# Altium footprint library PBL - THD Packages.PcbLib: 256 footprints (part 8 of 16)
Each footprint in its own frame and in the unit in brackets; x right, y up, seen from the top. Pads: shape width x height; smd on the part's side, far side on the other; paste and mask are expansions set on the pad; w line width, h text height; cw(c..) or ccw(c..) is an arc to the next point about the centre after c.
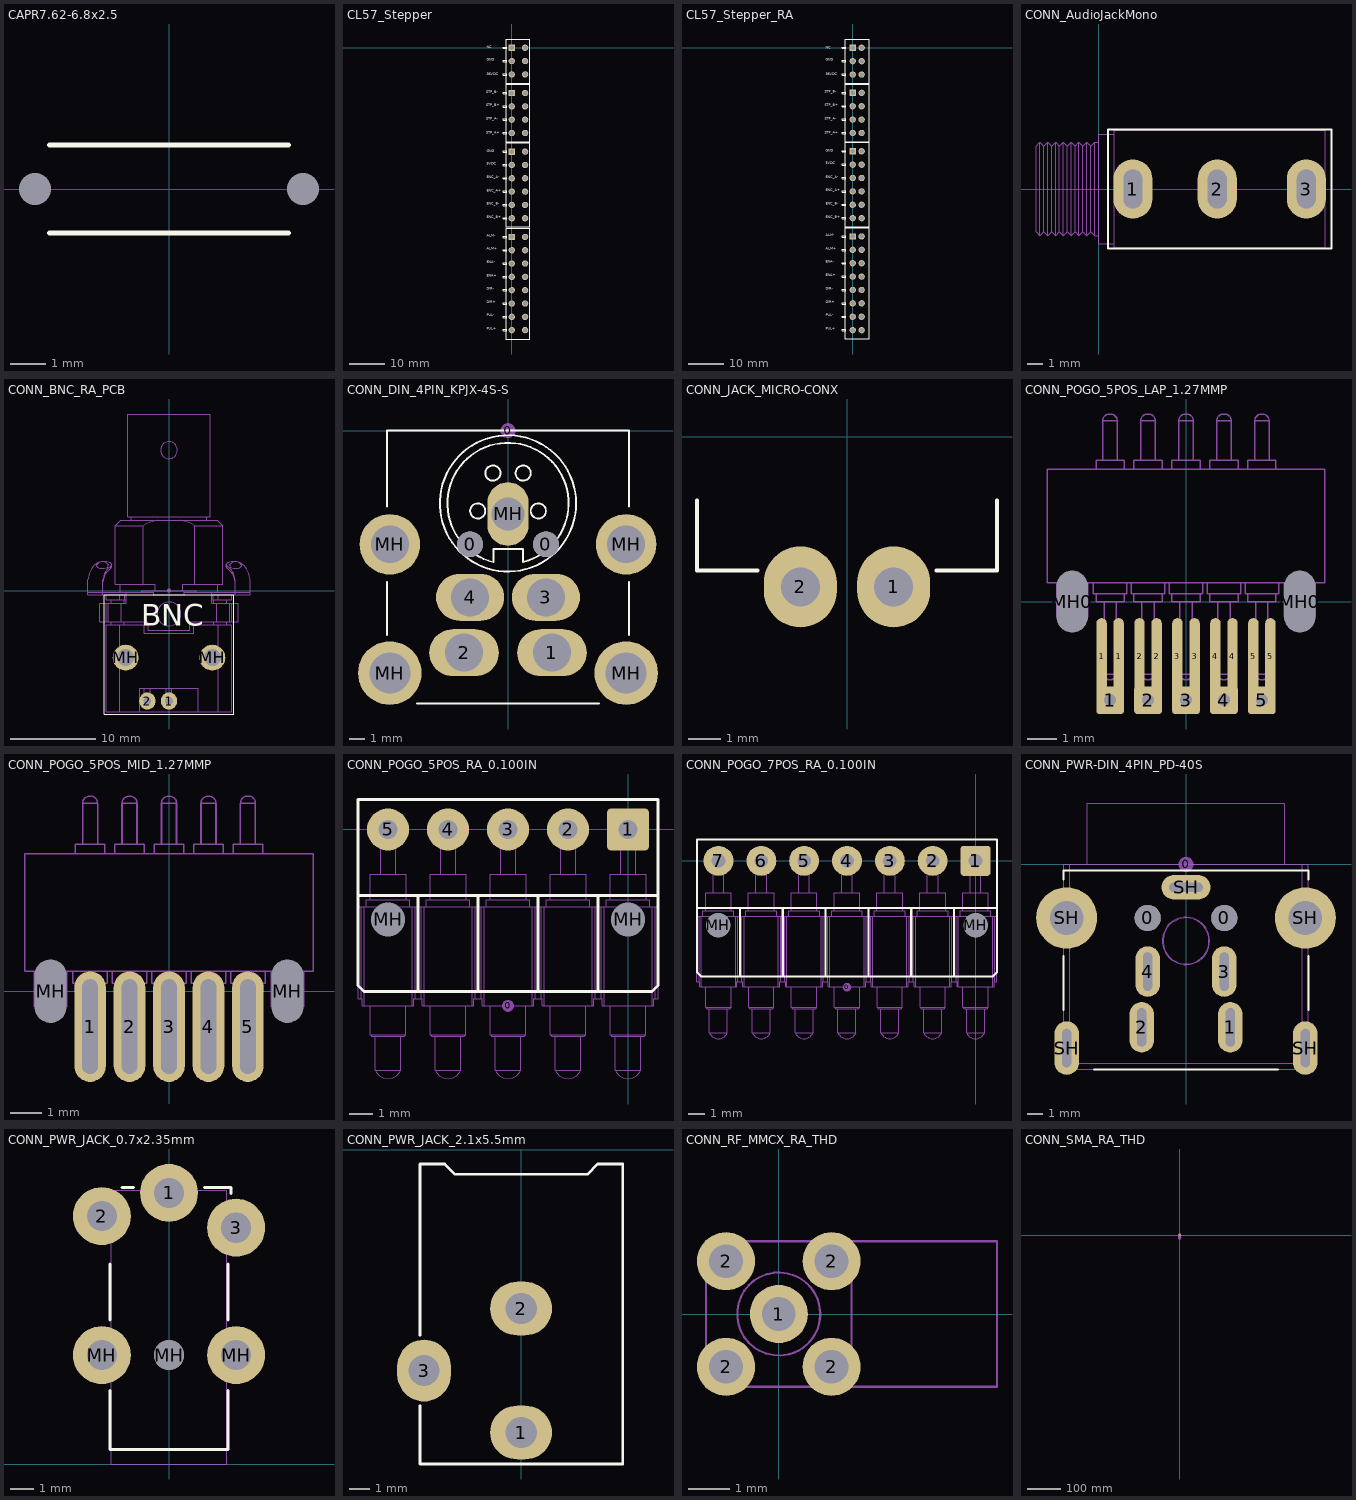
[diagram p7: the footprints below, top view; thin cyan lines are the x and y axes]

## CAPR7.62-6.8x2.5 [mil] "Capacitor, MF, Thru-Hole, Dipped Radial; Body 6.8 x 2.5 mm (WxT) Pin Spacing 7.62 mm (typ)"
height 236.22
pads (2):
  round 0 / inner round 0 / far side oval 100x85 hole 36 unplated: 1(-150,0) 2(150,0)
Top Overlay:
  lines w6: -133.86,-49.21 133.86,-49.21 ; -133.86,49.21 133.86,49.21
3D body "CAPMF_10.3x6.0x13.0mm WxTxH 7.5mmLS.STEP": height 511.81, standoff -100, extent -202.75,-118.1 202.76,118.12

## CL57_Stepper [mm]
pads (42):
  rect 1.8x1.8 hole 1.3: 1(0,0) 4(0,-12.954) 8(0,-29.718) 14(0,-54.102)
  round 1.8 hole 1.3: 1(3.81,0) 2(0,-3.81) 2(3.81,-3.81) 3(0,-7.62) 3(3.81,-7.62) 4(3.81,-12.954) 5(0,-16.764) 5(3.81,-16.764) 6(0,-20.574) 6(3.81,-20.574) 7(0,-24.384) 7(3.81,-24.384) 8(3.81,-29.718) 9(0,-33.528) 9(3.81,-33.528) 10(0,-37.338) 10(3.81,-37.338) 11(0,-41.148) 11(3.81,-41.148) 12(0,-44.958) 12(3.81,-44.958) 13(0,-48.768) 13(3.81,-48.768) 14(3.81,-54.102) 15(0,-57.912) 15(3.81,-57.912) 16(0,-61.722) 16(3.81,-61.722) 17(0,-65.532) 17(3.81,-65.532) 18(0,-69.342) 18(3.81,-69.342) 19(0,-73.152) 19(3.81,-73.152) 20(0,-76.962) 20(3.81,-76.962) 21(0,-80.772) 21(3.81,-80.772)
Top Overlay:
  lines w0.1: -2.4,-80.972 -2.4,-80.572 -1.4,-80.572 -1.4,-80.972 -2.4,-80.972 ; -2.4,-77.162 -2.4,-76.762 -1.4,-76.762 -1.4,-77.162 -2.4,-77.162 ; -2.4,-73.352 -2.4,-72.952 -1.4,-72.952 -1.4,-73.352 -2.4,-73.352 ; -2.4,-69.542 -2.4,-69.142 -1.4,-69.142 -1.4,-69.542 -2.4,-69.542 ; -2.4,-65.732 -2.4,-65.332 -1.4,-65.332 -1.4,-65.732 -2.4,-65.732 ; -2.4,-61.922 -2.4,-61.522 -1.4,-61.522 -1.4,-61.922 -2.4,-61.922 ; -2.4,-58.112 -2.4,-57.712 -1.4,-57.712 -1.4,-58.112 -2.4,-58.112 ; -2.4,-54.302 -2.4,-53.902 -1.4,-53.902 -1.4,-54.302 -2.4,-54.302 ; -2.4,-48.968 -2.4,-48.568 -1.4,-48.568 -1.4,-48.968 -2.4,-48.968 ; -2.4,-45.158 -2.4,-44.758 -1.4,-44.758 -1.4,-45.158 -2.4,-45.158 ; -2.4,-41.348 -2.4,-40.948 -1.4,-40.948 -1.4,-41.348 -2.4,-41.348 ; -2.4,-37.538 -2.4,-37.138 -1.4,-37.138 -1.4,-37.538 -2.4,-37.538 ; -2.4,-33.728 -2.4,-33.328 -1.4,-33.328 -1.4,-33.728 -2.4,-33.728 ; -2.4,-29.918 -2.4,-29.518 -1.4,-29.518 -1.4,-29.918 -2.4,-29.918 ; -2.4,-24.584 -2.4,-24.184 -1.4,-24.184 -1.4,-24.584 -2.4,-24.584 ; -2.4,-20.774 -2.4,-20.374 -1.4,-20.374 -1.4,-20.774 -2.4,-20.774 ; -2.4,-16.964 -2.4,-16.564 -1.4,-16.564 -1.4,-16.964 -2.4,-16.964 ; -2.4,-13.154 -2.4,-12.754 -1.4,-12.754 -1.4,-13.154 -2.4,-13.154 ; -2.4,-7.82 -2.4,-7.42 -1.4,-7.42 -1.4,-7.82 -2.4,-7.82 ; -2.4,-4.01 -2.4,-3.61 -1.4,-3.61 -1.4,-4.01 -2.4,-4.01 ; -2.4,-0.2 -2.4,0.2 -1.4,0.2 -1.4,-0.2 -2.4,-0.2 ; -1.7,-83.302 -1.7,-51.602 5.2,-51.602 5.2,-83.302 -1.7,-83.302 ; -1.7,-51.218 5.2,-51.218 5.2,-27.218 -1.7,-27.218 -1.7,-51.218 ; -1.7,-26.854 -1.7,-10.454 5.2,-10.454 5.2,-26.854 -1.7,-26.854 ; -1.7,-10.1 -1.7,2.5 5.2,2.5 5.2,-10.1 -1.7,-10.1
  text "PUL+" at -7.112,-80.959 h1.2
  text "PUL-" at -7.112,-77.149 h1.2
  text "DIR+" at -7.112,-73.352 h1.2
  text "DIR-" at -7.112,-69.542 h1.2
  text "ENA+" at -7.112,-65.732 h1.2
  text "ENA-" at -7.112,-61.922 h1.2
  text "ALM+" at -7.112,-58.112 h1.2
  text "ALM-" at -7.112,-54.302 h1.2
  text "STP_B-" at -7.366,-13.249 h1.2
  text "STP_B+" at -7.366,-17.059 h1.2
  text "STP_A-" at -7.366,-20.869 h1.2
  text "STP_A+" at -7.366,-24.933 h1.2
  text "GND" at -7.112,-30.213 h1.2
  text "5VDC" at -7.112,-33.715 h1.2
  text "NC" at -7.112,-0.495 h1.2
  text "GND" at -7.112,-3.997 h1.2
  text "36VDC" at -7.112,-8.115 h1.2
  text "ENC_B-" at -7.112,-45.253 h1.2
  text "ENC_B+" at -7.112,-49.063 h1.2
  text "ENC_A+" at -7.112,-41.443 h1.2
  text "ENC_A-" at -7.112,-37.633 h1.2
3D body "CL57_asm.STEP": height 79.2, standoff 10, extent -10.668,-99.49 15.832,16.51

## CL57_Stepper_RA [mm]
pads (42):
  rect 1.8x1.8 hole 1.3: 1(0,0) 4(0,-12.827) 8(0,-29.464) 14(0,-53.721)
  round 1.8 hole 1.3: 1(2.54,0) 2(0,-3.81) 2(2.54,-3.81) 3(0,-7.62) 3(2.54,-7.62) 4(2.54,-12.827) 5(0,-16.637) 5(2.54,-16.637) 6(0,-20.447) 6(2.54,-20.447) 7(0,-24.257) 7(2.54,-24.257) 8(2.54,-29.464) 9(0,-33.274) 9(2.54,-33.274) 10(0,-37.084) 10(2.54,-37.084) 11(0,-40.894) 11(2.54,-40.894) 12(0,-44.704) 12(2.54,-44.704) 13(0,-48.514) 13(2.54,-48.514) 14(2.54,-53.721) 15(0,-57.531) 15(2.54,-57.531) 16(0,-61.341) 16(2.54,-61.341) 17(0,-65.151) 17(2.54,-65.151) 18(0,-68.961) 18(2.54,-68.961) 19(0,-72.771) 19(2.54,-72.771) 20(0,-76.581) 20(2.54,-76.581) 21(0,-80.391) 21(2.54,-80.391)
Top Overlay:
  lines w0.1: -2.94,-80.591 -1.94,-80.591 -1.94,-80.191 -2.94,-80.191 -2.94,-80.591 ; -2.94,-76.781 -1.94,-76.781 -1.94,-76.381 -2.94,-76.381 -2.94,-76.781 ; -2.94,-72.971 -1.94,-72.971 -1.94,-72.571 -2.94,-72.571 -2.94,-72.971 ; -2.94,-69.161 -1.94,-69.161 -1.94,-68.761 -2.94,-68.761 -2.94,-69.161 ; -2.94,-65.351 -1.94,-65.351 -1.94,-64.951 -2.94,-64.951 -2.94,-65.351 ; -2.94,-61.541 -1.94,-61.541 -1.94,-61.141 -2.94,-61.141 -2.94,-61.541 ; -2.94,-57.731 -1.94,-57.731 -1.94,-57.331 -2.94,-57.331 -2.94,-57.731 ; -2.94,-53.921 -1.94,-53.921 -1.94,-53.521 -2.94,-53.521 -2.94,-53.921 ; -2.94,-48.714 -1.94,-48.714 -1.94,-48.314 -2.94,-48.314 -2.94,-48.714 ; -2.94,-44.904 -1.94,-44.904 -1.94,-44.504 -2.94,-44.504 -2.94,-44.904 ; -2.94,-41.094 -1.94,-41.094 -1.94,-40.694 -2.94,-40.694 -2.94,-41.094 ; -2.94,-37.284 -1.94,-37.284 -1.94,-36.884 -2.94,-36.884 -2.94,-37.284 ; -2.94,-33.474 -1.94,-33.474 -1.94,-33.074 -2.94,-33.074 -2.94,-33.474 ; -2.94,-29.664 -1.94,-29.664 -1.94,-29.264 -2.94,-29.264 -2.94,-29.664 ; -2.94,-24.457 -1.94,-24.457 -1.94,-24.057 -2.94,-24.057 -2.94,-24.457 ; -2.94,-20.647 -1.94,-20.647 -1.94,-20.247 -2.94,-20.247 -2.94,-20.647 ; -2.94,-16.837 -1.94,-16.837 -1.94,-16.437 -2.94,-16.437 -2.94,-16.837 ; -2.94,-13.027 -1.94,-13.027 -1.94,-12.627 -2.94,-12.627 -2.94,-13.027 ; -2.94,-7.82 -1.94,-7.82 -1.94,-7.42 -2.94,-7.42 -2.94,-7.82 ; -2.94,-4.01 -1.94,-4.01 -1.94,-3.61 -2.94,-3.61 -2.94,-4.01 ; -2.94,-0.2 -1.94,-0.2 -1.94,0.2 -2.94,0.2 -2.94,-0.2 ; -2.24,-82.921 4.66,-82.921 4.66,-51.221 -2.24,-51.221 -2.24,-82.921 ; -2.24,-50.964 -2.24,-26.964 4.66,-26.964 4.66,-50.964 -2.24,-50.964 ; -2.24,-26.727 4.66,-26.727 4.66,-10.327 -2.24,-10.327 -2.24,-26.727 ; -2.24,-10.1 4.66,-10.1 4.66,2.5 -2.24,2.5 -2.24,-10.1
  text "ENC_A-" at -7.652,-37.379 h1.2
  text "ENC_A+" at -7.652,-41.189 h1.2
  text "ENC_B+" at -7.652,-48.809 h1.2
  text "ENC_B-" at -7.652,-44.999 h1.2
  text "36VDC" at -7.652,-8.115 h1.2
  text "GND" at -7.652,-3.997 h1.2
  text "NC" at -7.652,-0.495 h1.2
  text "5VDC" at -7.652,-33.461 h1.2
  text "GND" at -7.652,-29.959 h1.2
  text "STP_A+" at -7.906,-24.806 h1.2
  text "STP_A-" at -7.906,-20.742 h1.2
  text "STP_B+" at -7.906,-16.932 h1.2
  text "STP_B-" at -7.906,-13.122 h1.2
  text "ALM-" at -7.652,-53.921 h1.2
  text "ALM+" at -7.652,-57.731 h1.2
  text "ENA-" at -7.652,-61.541 h1.2
  text "ENA+" at -7.652,-65.351 h1.2
  text "DIR-" at -7.652,-69.161 h1.2
  text "DIR+" at -7.652,-72.971 h1.2
  text "PUL-" at -7.652,-76.768 h1.2
  text "PUL+" at -7.652,-80.578 h1.2
3D body "CL57_asm.STEP": height 16.5, standoff -10, extent 6.6,-98 75.8,18

## CONN_AudioJackMono [mm] "CUI MJ-3502 3.5mm audio jack - mono"
height 11.3
pads (3):
  oval 2.5x3.8 hole 1.2 slot 2.5 at 90 deg: 1(2.2,0) 2(7.6,0) 3(13.3,0)
Top Overlay:
  lines w0.127: 0.6,-3.8 14.9,-3.8 14.9,3.8 0.6,3.8 0.6,-3.8
13 - 3D Top Side:
  lines w0.05: 0,-3 -0.25,-3 ; 0,3 -0.25,3 ; 1,-3.5 0,-3.5 0,3.5 1,3.5 ; -3.75,-3 -3.75,3 ; -3.75,-3 -3.5,-2.75 ; -3.75,-3 -4,-2.75 -4,2.75 -3.75,3 ; -3.75,3 -3.5,2.75 ; -3.5,-2.75 -3.5,2.75 ; -3.5,-2.75 -3.25,-3 ; -3.5,2.75 -3.25,3 ; -3.25,-3 -3.25,3 ; -3.25,-3 -3,-2.75 ; -3.25,3 -3,2.75 ; -3,-2.75 -3,2.75 ; -3,-2.75 -2.75,-3 ; -3,2.75 -2.75,3 ; -2.75,-3 -2.75,3 ; -2.75,-3 -2.5,-2.75 ; -2.75,3 -2.5,2.75 ; -2.5,-2.75 -2.5,2.75 ; -2.5,-2.75 -2.25,-3 ; -2.5,2.75 -2.25,3 ; -2.25,-3 -2.25,3 ; -2.25,-3 -2,-2.75 ; -2.25,3 -2,2.75 ; -2,-2.75 -2,2.75 ; -2,-2.75 -1.75,-3 ; -2,2.75 -1.75,3 ; -1.75,-3 -1.75,3 ; -1.75,-3 -1.5,-2.75 ; -1.75,3 -1.5,2.75 ; -1.5,-2.75 -1.5,2.75 ; -1.5,-2.75 -1.25,-3 ; -1.5,2.75 -1.25,3 ; -1.25,-3 -1.25,3 ; -1.25,-3 -1,-2.75 ; -1.25,3 -1,2.75 ; -1,-2.75 -1,2.75 ; -1,-2.75 -0.75,-3 ; -1,2.75 -0.75,3 ; -0.75,-3 -0.75,3 ; -0.75,-3 -0.5,-2.75 ; -0.75,3 -0.5,2.75 ; -0.5,-2.75 -0.5,2.75 ; -0.5,-2.75 -0.25,-3 ; -0.5,2.75 -0.25,3 ; -0.25,-3 -0.25,3 ; 1,-3.75 1,3.75 14.5,3.75 14.5,-3.75 1,-3.75
3D body "Mono Connector MJ-3502.STEP": height 11.3, standoff -4.1, extent -4,-3.75 14.5,3.75

## CONN_BNC_RA_PCB [mil] "BNC connector, right angle PCB-mounted"
height 530
pads (5):
  round 20 on Mech15: 0(0,0)
  oval 75x80 hole 35: 1(0,-510) 2(-100,-510)
  round 120 hole 79: MH(-200,-310) MH(200,-310)
Top Overlay:
  lines w5: -300,-570 300,-570 300,-20 -300,-20 -300,-570
  text "BNC" at -127.35,-163 h100
13 - 3D Top Side:
  drawing of 173 lines, arcs and shapes, not listed
3D body "BNC Conn RA PCB Mount.STEP": height 532, standoff -135, extent -375,-559.78 375,815.22

## CONN_DIN_4PIN_KPJX-4S-S [mm] "Power Connector, 4-pin DIN"
height 15
pads (12):
  round 1.7 hole 1.7 unplated: 0(-2.5,-7.5) 0(2.5,-7.5)
  round 1 on Mech15: 0(0,0)
  oval 4.6x3.1 hole 2.5: 1(2.9,-14.65) 2(-2.9,-14.65)
  oval 4.5x3.1 hole 2.5: 3(2.5,-11) 4(-2.5,-11)
  round 4.2 hole 2.7: MH(-7.8,-16) MH(7.8,-16)
  round 4 hole 2.5: MH(-7.8,-7.5) MH(7.8,-7.5)
  oval 2.7x4.2 hole 2.2: MH(0,-5.5)
Top Overlay:
  circle w0.127: c0,-4.8 r4.5
  circle w0.127: c1,-2.8 r0.5
  circle w0.127: c-1,-2.8 r0.5
  circle w0.127: c-2,-5.3 r0.5
  circle w0.127: c2,-5.3 r0.5
  lines w0.127: -8,-13.5 -8,-10 ; -8,-5 -8,0 8,0 8,-5 ; -6,-18 6,-18 ; 1,-8.671 1,-7.8 -0.97,-7.8 -0.97,-8.681 cw(c0,-4.8) 1.007,-8.671 ; 8,-13.5 8,-10
3D body "User Library-KPJX-4S-S.STEP": height 15.01, standoff -3.49, extent -8,-17.65 8,0

## CONN_JACK_MICRO-CONX [mil] "Micro-ConX 17292-2PG-300"
height 480
pads (2):
  oval 90x100 hole 48: 1(57.5,-185) 2(-57.5,-185)
Top Overlay:
  lines w5: -185,-78.74 -185,-165 -110.24,-165 ; 110.24,-165 185,-165 185,-78.74
3D body "Micro-ConX for PCB mount.STEP": height 476.88, standoff -146.88, extent -312.51,-205 310.03,547.5

## CONN_POGO_5POS_LAP_1.27MMP [mm] "Programming connector; lap-soldered 5 Position pogo style, 0.050\" pitch"
height 1.308
pads (17):
  oval 0.35x2.54 smd: 1(-2.825,-1.825) 1(-2.255,-1.825) 2(-1.555,-1.825) 2(-0.985,-1.825) 3(-0.285,-1.825) 3(0.285,-1.825) 4(0.985,-1.825) 4(1.555,-1.825) 5(2.255,-1.825) 5(2.825,-1.825)
  rrect20% 0.925x0.925 hole 0.4 mask+0.1: 1(-2.54,-3.3) 2(-1.27,-3.3) 3(0,-3.3) 4(1.27,-3.3) 5(2.54,-3.3)
  oval 0.991x2.007 hole 1.041 slot 2.057 at 90 deg unplated: MH0(-3.81,0) MH0(3.81,0)
Top Solder:
  rectangle: -2.825,-3.075 -2.25,-0.575
  rectangle: -1.555,-3.075 -0.98,-0.575
  rectangle: -0.285,-3.075 0.29,-0.575
  rectangle: 0.985,-3.075 1.56,-0.575
  rectangle: 2.255,-3.075 2.83,-0.575
13 - 3D Top Side:
  lines w0.05: -4.331,0.635 -4.331,-0.508 -3.289,-0.508 -3.289,0.635 ; -3.099,0.635 -3.099,0.254 -1.981,0.254 -1.981,0.635 ; -3.01,0.254 -3.01,0 -2.07,0 -2.07,0.254 ; -3.01,4.42 -3.01,4.724 -2.07,4.724 -2.07,4.42 ; -2.781,4.724 -2.781,6.045 ; -2.743,0 -2.743,-2.438 ; -2.337,0 -2.337,-2.438 ; -2.299,4.724 -2.299,6.045 ; -1.829,0.635 -1.829,0.254 -0.711,0.254 -0.711,0.635 ; -1.74,0.254 -1.74,0 -0.8,0 -0.8,0.254 ; -1.74,4.42 -1.74,4.724 -0.8,4.724 -0.8,4.42 ; -1.511,4.724 -1.511,6.045 ; -1.473,0 -1.473,-2.438 ; -1.067,0 -1.067,-2.438 ; -1.029,4.724 -1.029,6.045 ; -0.559,0.635 -0.559,0.254 0.559,0.254 0.559,0.635 ; -0.47,0.254 -0.47,0 0.47,0 0.47,0.254 ; -0.47,4.42 -0.47,4.724 0.47,4.724 0.47,4.42 ; -0.241,4.724 -0.241,6.045 ; -0.203,0 -0.203,-2.438 ; 0.203,0 0.203,-2.438 ; 0.241,4.724 0.241,6.045 ; 0.711,0.635 0.711,0.254 1.829,0.254 1.829,0.635 ; 0.8,0.254 0.8,0 1.74,0 1.74,0.254 ; 0.8,4.42 0.8,4.724 1.74,4.724 1.74,4.42 ; 1.029,4.724 1.029,6.045 ; 1.067,0 1.067,-2.438 ; 1.473,0 1.473,-2.438 ; 1.511,4.724 1.511,6.045 ; 1.981,0.635 1.981,0.254 3.099,0.254 3.099,0.635 ; 2.07,0.254 2.07,0 3.01,0 3.01,0.254 ; 2.07,4.42 2.07,4.724 3.01,4.724 3.01,4.42 ; 2.299,4.724 2.299,6.045 ; 2.337,0 2.337,-2.438 ; 2.743,0 2.743,-2.438 ; 2.781,4.724 2.781,6.045 ; 3.289,0.635 3.289,-0.508 4.331,-0.508 4.331,0.635 ; -2.781,6.045 cw(c-2.553,6.045) -2.553,6.274 -2.527,6.274 cw(c-2.527,6.045) -2.299,6.045 ; -2.781,6.045 -2.299,6.045 ; -2.743,-2.438 ccw(c-2.565,-2.438) -2.565,-2.616 -2.515,-2.616 ccw(c-2.515,-2.438) -2.337,-2.438 ; -2.743,-2.438 -2.337,-2.438 ; -1.511,6.045 cw(c-1.283,6.045) -1.283,6.274 -1.257,6.274 cw(c-1.257,6.045) -1.029,6.045 ; -1.511,6.045 -1.029,6.045 ; -1.473,-2.438 ccw(c-1.295,-2.438) -1.295,-2.616 -1.245,-2.616 ccw(c-1.245,-2.438) -1.067,-2.438 ; -1.473,-2.438 -1.067,-2.438 ; -0.241,6.045 cw(c-0.013,6.045) -0.013,6.274 0.013,6.274 cw(c0.013,6.045) 0.241,6.045 ; -0.241,6.045 0.241,6.045 ; -0.203,-2.438 ccw(c-0.025,-2.438) -0.025,-2.616 0.025,-2.616 ccw(c0.025,-2.438) 0.203,-2.438 ; -0.203,-2.438 0.203,-2.438 ; 1.029,6.045 cw(c1.257,6.045) 1.257,6.274 1.283,6.274 cw(c1.283,6.045) 1.511,6.045 ; 1.029,6.045 1.511,6.045 ; 1.067,-2.438 ccw(c1.245,-2.438) 1.245,-2.616 1.295,-2.616 ccw(c1.295,-2.438) 1.473,-2.438 ; 1.067,-2.438 1.473,-2.438 ; 2.299,6.045 cw(c2.527,6.045) 2.527,6.274 2.553,6.274 cw(c2.553,6.045) 2.781,6.045 ; 2.299,6.045 2.781,6.045 ; 2.337,-2.438 ccw(c2.515,-2.438) 2.515,-2.616 2.565,-2.616 ccw(c2.565,-2.438) 2.743,-2.438 ; 2.337,-2.438 2.743,-2.438 ; -4.635,0.635 -4.635,4.42 4.635,4.42 4.635,0.635 -4.635,0.635
3D body "CONN_POGO_50MIL_05POS_LAP.STEP": height 1.31, standoff -0.9, extent -4.635,-2.616 4.636,6.274

## CONN_POGO_5POS_MID_1.27MMP [mil] "Programming connector; lap-soldered 5 Position pogo style, 0.050\" pitch"
height 13
pads (7):
  oval 40x140 hole 20 slot 120 at 90 deg: 1(-100,-45) 2(-50,-45) 3(0,-45) 4(50,-45) 5(100,-45)
  oval 38x78 hole 40 slot 80 at 90 deg unplated: MH(-150,0) MH(150,0)
Top Overlay:
  text "." at -100,-150 h3.94
Bottom Overlay:
  text "." at -100,-150 h3.94
13 - 3D Top Side:
  lines w1.97: -170.5,25 -170.5,-20 -129.5,-20 -129.5,25 ; -122,25 -122,10 -78,10 -78,25 ; -118.5,10 -118.5,0 -81.5,0 -81.5,10 ; -118.5,174 -118.5,186 -81.5,186 -81.5,174 ; -109.5,186 -109.5,238 ; -108,0 -108,-96 ; -92,0 -92,-96 ; -90.5,186 -90.5,238 ; -72,25 -72,10 -28,10 -28,25 ; -68.5,10 -68.5,0 -31.5,0 -31.5,10 ; -68.5,174 -68.5,186 -31.5,186 -31.5,174 ; -59.5,186 -59.5,238 ; -58,0 -58,-96 ; -42,0 -42,-96 ; -40.5,186 -40.5,238 ; -22,25 -22,10 22,10 22,25 ; -18.5,10 -18.5,0 18.5,0 18.5,10 ; -18.5,174 -18.5,186 18.5,186 18.5,174 ; -9.5,186 -9.5,238 ; -8,0 -8,-96 ; 8,0 8,-96 ; 9.5,186 9.5,238 ; 28,25 28,10 72,10 72,25 ; 31.5,10 31.5,0 68.5,0 68.5,10 ; 31.5,174 31.5,186 68.5,186 68.5,174 ; 40.5,186 40.5,238 ; 42,0 42,-96 ; 58,0 58,-96 ; 59.5,186 59.5,238 ; 78,25 78,10 122,10 122,25 ; 81.5,10 81.5,0 118.5,0 118.5,10 ; 81.5,174 81.5,186 118.5,186 118.5,174 ; 90.5,186 90.5,238 ; 92,0 92,-96 ; 108,0 108,-96 ; 109.5,186 109.5,238 ; 129.5,25 129.5,-20 170.5,-20 170.5,25 ; -109.5,238 cw(c-100.5,238) -100.5,247 -99.5,247 cw(c-99.5,238) -90.5,238 ; -109.5,238 -90.5,238 ; -108,-96 ccw(c-101,-96) -101,-103 -99,-103 ccw(c-99,-96) -92,-96 ; -108,-96 -92,-96 ; -59.5,238 cw(c-50.5,238) -50.5,247 -49.5,247 cw(c-49.5,238) -40.5,238 ; -59.5,238 -40.5,238 ; -58,-96 ccw(c-51,-96) -51,-103 -49,-103 ccw(c-49,-96) -42,-96 ; -58,-96 -42,-96 ; -9.5,238 cw(c-0.5,238) -0.5,247 0.5,247 cw(c0.5,238) 9.5,238 ; -9.5,238 9.5,238 ; -8,-96 ccw(c-1,-96) -1,-103 1,-103 ccw(c1,-96) 8,-96 ; -8,-96 8,-96 ; 40.5,238 cw(c49.5,238) 49.5,247 50.5,247 cw(c50.5,238) 59.5,238 ; 40.5,238 59.5,238 ; 42,-96 ccw(c49,-96) 49,-103 51,-103 ccw(c51,-96) 58,-96 ; 42,-96 58,-96 ; 90.5,238 cw(c99.5,238) 99.5,247 100.5,247 cw(c100.5,238) 109.5,238 ; 90.5,238 109.5,238 ; 92,-96 ccw(c99,-96) 99,-103 101,-103 ccw(c101,-96) 108,-96 ; 92,-96 108,-96 ; -182.5,25 182.5,25 182.5,174 -182.5,174 -182.5,25
3D body "CONN_POGO_50MIL_05POS_LAP.STEP": height 12.5, standoff -74.5, extent -182.49,-102.99 182.51,247

## CONN_POGO_5POS_RA_0.100IN [mil] "Connector; Pogo pins; 5 Position"
height 100
pads (8):
  round 20 on Mech15: 0(-200,-294)
  rrect20% 70x70 hole 32: 1(0,0)
  round 70 hole 32: 2(-100,0) 3(-200,0) 4(-300,0) 5(-400,0)
  round 55 hole 57 unplated: MH(-400,-150) MH(0,-150)
Top Overlay:
  lines w5: -450,-110 50,-110 ; -350,-270 -350,-110 ; -250,-270 -250,-110 ; -150,-270 -150,-110 ; -50,-270 -50,-110 ; -450,-260 -440,-270 40,-270 50,-260 50,50 -450,50 -450,-260
13 - 3D Top Side:
  lines w1.97: -445,-282 -445,-129 ; -440,-294 -440,-129 ; -436,-129 -436,-117 -364,-117 -364,-129 ; -430,-117 -430,-75 -370,-75 -370,-117 ; -429.5,-294 -429.5,-342.17 ; -421,-345 -421,-400.97 ; -412.5,-75 -412.5,0 cw(c-400,0) -387.5,0 -387.5,-75 ; -412.5,-25 -387.5,-25 ; -379,-345 -379,-400.97 ; -370.5,-294 -370.5,-342.17 ; -360,-294 -360,-129 ; -355,-282 -355,-129 ; -345,-282 -345,-129 ; -340,-294 -340,-129 ; -336,-129 -336,-117 -264,-117 -264,-129 ; -330,-117 -330,-75 -270,-75 -270,-117 ; -329.5,-294 -329.5,-342.17 ; -321,-345 -321,-400.97 ; -312.5,-75 -312.5,0 cw(c-300,0) -287.5,0 -287.5,-75 ; -312.5,-25 -287.5,-25 ; -279,-345 -279,-400.97 ; -270.5,-294 -270.5,-342.17 ; -260,-294 -260,-129 ; -255,-282 -255,-129 ; -245,-282 -245,-129 ; -240,-294 -240,-129 ; -236,-129 -236,-117 -164,-117 -164,-129 ; -230,-117 -230,-75 -170,-75 -170,-117 ; -229.5,-294 -229.5,-342.17 ; -221,-345 -221,-400.97 ; -212.5,-75 -212.5,0 cw(c-200,0) -187.5,0 -187.5,-75 ; -212.5,-25 -187.5,-25 ; -179,-345 -179,-400.97 ; -170.5,-294 -170.5,-342.17 ; -160,-294 -160,-129 ; -155,-282 -155,-129 ; -145,-282 -145,-129 ; -140,-294 -140,-129 ; -136,-129 -136,-117 -64,-117 -64,-129 ; -130,-117 -130,-75 -70,-75 -70,-117 ; -129.5,-294 -129.5,-342.17 ; -121,-345 -121,-400.97 ; -112.5,-75 -112.5,0 cw(c-100,0) -87.5,0 -87.5,-75 ; -112.5,-25 -87.5,-25 ; -79,-345 -79,-400.97 ; -70.5,-294 -70.5,-342.17 ; -60,-294 -60,-129 ; -55,-282 -55,-129 ; -45,-282 -45,-129 ; -40,-294 -40,-129 ; -36,-129 -36,-117 36,-117 36,-129 ; -30,-117 -30,-75 30,-75 30,-117 ; -29.5,-294 -29.5,-342.17 ; -21,-345 -21,-400.97 ; -12.5,-75 -12.5,0 cw(c0,0) 12.5,0 12.5,-75 ; -12.5,-25 12.5,-25 ; 21,-345 21,-400.97 ; 29.5,-294 29.5,-342.17 ; 40,-294 40,-129 ; 45,-282 45,-129 ; -429.5,-342.17 -370.5,-342.17 ; -429.5,-342.17 -426.67,-345 -373.33,-345 -370.5,-342.17 ; -421,-400.97 ccw(c-400,-392.27) -379,-400.97 ; -421,-400.97 -379,-400.97 ; -329.5,-342.17 -270.5,-342.17 ; -329.5,-342.17 -326.67,-345 -273.33,-345 -270.5,-342.17 ; -321,-400.97 ccw(c-300,-392.27) -279,-400.97 ; -321,-400.97 -279,-400.97 ; -229.5,-342.17 -170.5,-342.17 ; -229.5,-342.17 -226.67,-345 -173.33,-345 -170.5,-342.17 ; -221,-400.97 ccw(c-200,-392.27) -179,-400.97 ; -221,-400.97 -179,-400.97 ; -129.5,-342.17 -70.5,-342.17 ; -129.5,-342.17 -126.67,-345 -73.33,-345 -70.5,-342.17 ; -121,-400.97 ccw(c-100,-392.27) -79,-400.97 ; -121,-400.97 -79,-400.97 ; -29.5,-342.17 29.5,-342.17 ; -29.5,-342.17 -26.67,-345 26.67,-345 29.5,-342.17 ; -21,-400.97 ccw(c0,-392.27) 21,-400.97 ; -21,-400.97 21,-400.97 ; -450,-282 -450,-129 50,-129 50,-282 43.33,-282 43.33,-294 -43.33,-294 -43.33,-282 -56.67,-282 -56.67,-294 -143.33,-294 -143.33,-282 -156.67,-282 -156.67,-294 -243.33,-294 -243.33,-282 -256.67,-282 -256.67,-294 -343.33,-294 -343.33,-282 -356.67,-282 -356.67,-294 -443.33,-294 -443.33,-282 -450,-282
3D body "CONN_POGO_RA_5POS.STEP": height 100, standoff -127, extent -449.99,-414.99 50.01,12.51

## CONN_POGO_7POS_RA_0.100IN [mil] "Connector; Pogo pins; 7 Position"
height 100
pads (10):
  round 20 on Mech15: 0(-300,-295)
  rrect20% 70x70 hole 32: 1(0,0)
  round 70 hole 32: 2(-100,0) 3(-200,0) 4(-300,0) 5(-400,0) 6(-500,0) 7(-600,0)
  round 55 hole 57 unplated: MH(-600,-150) MH(0,-150)
Top Overlay:
  lines w5: -650,-110 50,-110 ; -550,-270 -550,-110 ; -450,-270 -450,-110 ; -350,-270 -350,-110 ; -250,-270 -250,-110 ; -150,-270 -150,-110 ; -50,-270 -50,-110 ; -650,-260 -650,50 50,50 50,-260 40,-270 -640,-270 -650,-260
13 - 3D Top Side:
  drawing of 200 lines, arcs and shapes, not listed
3D body "CONN_POGO_RA_7POS.STEP": height 100, standoff -127, extent -649.99,-415 50.01,12.5

## CONN_PWR-DIN_4PIN_PD-40S [mm] "Power Connector, 4-pin DIN"
height 15
pads (12):
  round 1.7 hole 1.7 unplated: 0(-2.5,-3.5) 0(2.5,-3.5)
  round 1 on Mech15: 0(0,0)
  oval 1.6x3.3 hole 0.6 slot 2.5 at 90 deg: 1(2.9,-10.65) 2(-2.9,-10.65) 3(2.5,-7) 4(-2.5,-7)
  oval 1.6x3.5 hole 0.6 slot 2.5 at 90 deg: SH(-7.8,-12) SH(7.8,-12)
  round 4 hole 2.2: SH(-7.8,-3.5) SH(7.8,-3.5)
  oval 3.2x1.6 hole 0.6 slot 2.2 at 0 deg: SH(0,-1.5)
Top Overlay:
  lines w0.127: -8,-9.5 -8,-6 ; -8,-1 -8,-0.4 8,-0.4 8,-1 ; -6,-13.4 6,-13.4 ; 8,-9.5 8,-6
13 - 3D Top Side:
  circle w0.05: c0,-5 r1.5
  circle w0.05: c0,-5 r1.55
  lines w0.05: -7.6,0 -7.6,-13.4 ; -6.45,0 -6.45,4 6.45,4 6.45,0 ; 7.6,0 7.6,-13.4 ; -8,-13 ccw(c-7.6,-13) -7.6,-13.4 ; -8,-13 -8,0 8,0 8,-13 ; -8,-13 8,-13 ; -7.6,-13.4 7.6,-13.4 ; 7.6,-13.4 ccw(c7.6,-13) 8,-13
3D body "PD-40S.STEP": height 15, standoff -3.5, extent -8,-13.4 8,4

## CONN_PWR_JACK_0.7x2.35mm [mm] "Power Connector, 0.7mm ID, 2.35mm OD"
height 5
pads (6):
  round 2.5 hole 1.3: 1(0,11.7) 2(-2.9,10.7) 3(2.9,10.2) MH(-2.9,4.7) MH(2.9,4.7)
  round 1.3 hole 1.3 unplated: MH(0,4.7)
Top Overlay:
  lines w0.127: -2.54,3.175 -2.54,0.635 2.54,0.635 2.54,3.175 ; -2.54,6.223 -2.54,8.636 ; -2.032,11.938 -1.524,11.938 ; 1.524,11.938 2.667,11.938 2.667,11.684 ; 2.54,6.223 2.54,8.636
13 - 3D Top Side:
  lines w0.05: -2.819,4.204 -2.819,5.194 ; -2.819,10.198 -2.819,11.189 ; -2.502,4.204 -3.073,4.204 -3.073,5.194 -2.502,5.194 ; -2.502,10.198 -3.073,10.198 -3.073,11.189 -2.502,11.189 ; -0.495,11.811 -0.495,11.938 0.495,11.938 0.495,11.811 ; 2.502,4.204 3.073,4.204 3.073,5.194 2.502,5.194 ; 2.502,9.716 3.073,9.716 3.073,10.706 2.502,10.706 ; 2.819,4.204 2.819,5.194 ; 2.819,9.716 2.819,10.706 ; -2.502,0 -2.502,11.811 2.502,11.811 2.502,0 -2.502,0
3D body "Conn_Kobiconn_163-4307-E.stp": height 5, standoff -2.5, extent -3.309,0 3.309,12.054

## CONN_PWR_JACK_2.1x5.5mm [mm] "Power Connector, 2.1mm ID, 5.5mm OD"
height 11
pads (3):
  oval 3x2.6 hole 1.511: 1(0,-13.7) 2(0,-7.7)
  oval 2.6x3 hole 1.511: 3(-4.7,-10.7)
Top Overlay:
  lines w0.127: -4.9,-12.4 -4.9,-15.225 4.925,-15.225 4.925,-0.7 3.7,-0.7 3.2,-1.2 -3.2,-1.2 -3.7,-0.7 -4.9,-0.7 -4.9,-9
13 - 3D Top Side:
  lines w0.076: -4.9,-12.4 -4.9,-15.225 4.925,-15.225 4.925,-0.7 3.7,-0.7 3.2,-1.2 -3.2,-1.2 -3.7,-0.7 -4.9,-0.7 -4.9,-9
3D body "3100-522 Connector.stp": height 11, standoff -3.5, extent -4.9,-14.1 4.5,0

## CONN_RF_MMCX_RA_THD [mil] "RF connector, right-angle THD, TE 1-1634010-0 or TE 1408151"
height 149.61
pads (5):
  round 55 hole 32: 1(0,0) 2(-50,-50) 2(-50,50) 2(50,-50) 2(50,50)
13 - 3D Top Side:
  circle w1.97: c-0.09,0.01 r39.37
  circle w1.97: c0,0 r13.78
  lines w1.97: -68.9,-39.37 -39.37,-39.37 -39.37,-68.9 ; -68.9,39.37 -39.37,39.37 -39.37,68.9 ; -38.07,-9.54 ccw(c-3.54,-2.06) -29.28,-26.26 ; 9.57,-38.16 ccw(c1.62,-3.49) 26.2,-29.2 ; 29.21,26.34 cw(c3.99,2.19) 38.14,9.49 ; 37.1,-13.16 ccw(c4.48,-1.02) 39.27,-2.07 ; 39.37,-68.9 39.37,-39.37 68.9,-39.37 ; 39.37,68.9 39.37,39.37 68.9,39.37 ; 68.9,-68.9 68.9,68.9 ; -68.9,-68.9 -68.9,68.9 206.69,68.9 206.69,-68.9 -68.9,-68.9 ; -59.84,-59.84 -59.84,-40.16 -40.16,-40.16 -40.16,-59.84 -59.84,-59.84 ; -59.84,40.16 -59.84,59.84 -40.16,59.84 -40.16,40.16 -59.84,40.16 ; 40.16,-59.84 59.84,-59.84 59.84,-40.16 40.16,-40.16 40.16,-59.84 ; 40.16,40.16 59.84,40.16 59.84,59.84 40.16,59.84 40.16,40.16
3D body "MMCX connector 1408151-1.STEP": height 149.61, standoff -118.11, extent -68.89,-68.89 206.7,68.9

## CONN_SMA_RA_THD [mm]
height 10.43
pads (5):
  round 2.5 hole 1.5: 1(0,0)
  round 2.5 hole 1.6: 2(-2.54,-2.54) 2(-2.54,2.54) 2(2.54,-2.54) 2(2.54,2.54)
13 - 3D Top Side:
  drawing of 402 lines, arcs and shapes, not listed
3D body "SMA Conn TE 5-1814400-1.STEP": height 10.43, standoff -3.41, extent -3.173,-11.05 3.167,3.15